# Altium footprint library Connektor.PcbLib: 305 footprints (part 1 of 20)
Each footprint in its own frame and in the unit in brackets; x right, y up, seen from the top. Pads: shape width x height; smd on the part's side, far side on the other; paste and mask are expansions set on the pad; w line width, h text height; cw(c..) or ccw(c..) is an arc to the next point about the centre after c.
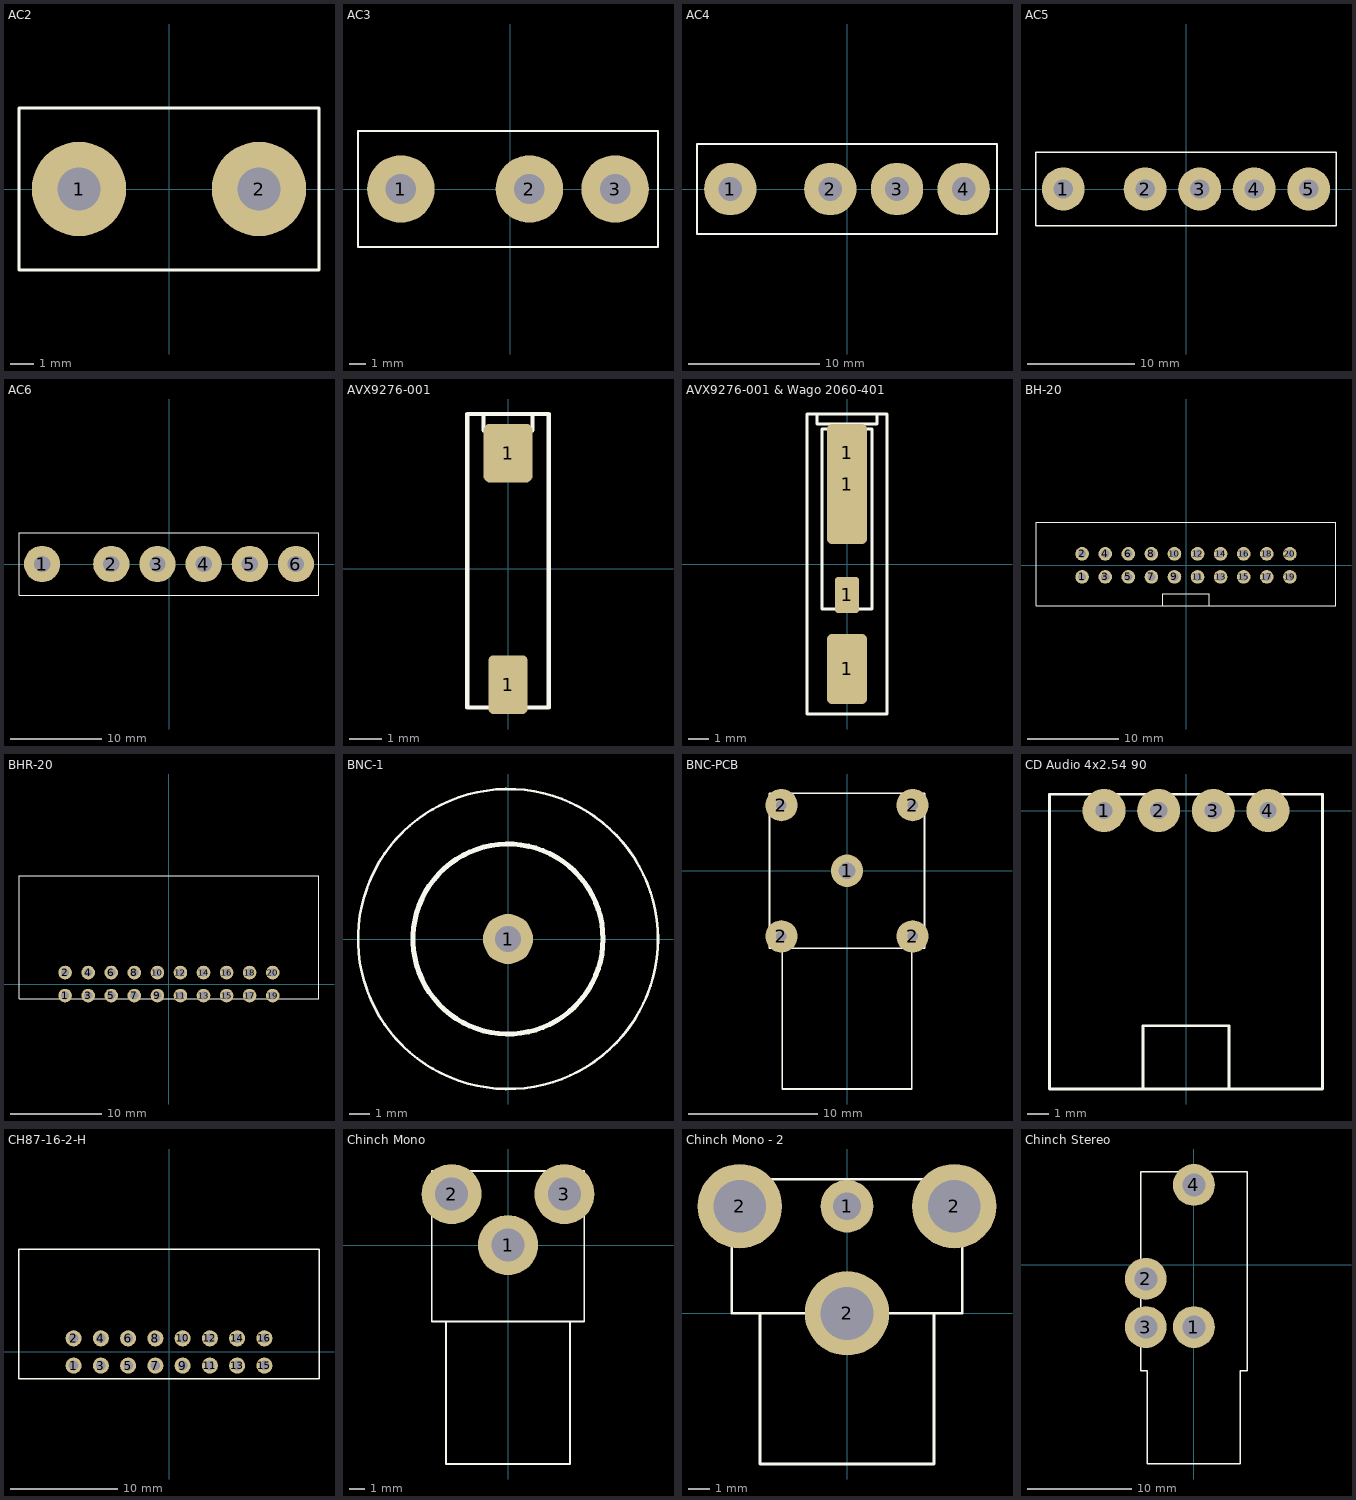
[diagram p0: the footprints below, top view; thin cyan lines are the x and y axes]

## AC2 [mm]
pads (2):
  round 4 hole 1.8: 1(-3.81,0) 2(3.81,0)
TopOverlay:
  lines w0.127: -6.35,-3.429 6.35,-3.429 6.35,3.429 -6.35,3.429 -6.35,-3.429
3D body: height 12.6, standoff -3.4, extent -6.3,-2.3 6.3,2.3

## AC3 [mm]
pads (3):
  round 4 hole 1.8: 1(-6.477,0) 2(1.143,0) 3(6.223,0)
TopOverlay:
  lines w0.127: -9.017,-3.429 -9.017,3.429 8.763,3.429 8.763,-3.429 -9.017,-3.429

## AC4 [mm]
pads (4):
  round 4 hole 1.8: 1(-8.89,0) 2(-1.27,0) 3(3.81,0) 4(8.89,0)
TopOverlay:
  lines w0.127: -11.43,-3.429 -11.43,3.429 11.43,3.429 11.43,-3.429 -11.43,-3.429

## AC5 [mm]
pads (5):
  round 4 hole 1.8: 1(-11.43,0) 2(-3.81,0) 3(1.27,0) 4(6.35,0) 5(11.43,0)
TopOverlay:
  lines w0.127: -13.97,-3.429 -13.97,3.429 13.97,3.429 13.97,-3.429 -13.97,-3.429

## AC6 [mm]
pads (6):
  round 4 hole 1.8: 1(-13.97,0) 2(-6.35,0) 3(-1.27,0) 4(3.81,0) 5(8.89,0) 6(13.97,0)
TopOverlay:
  lines w0.127: -16.51,-3.429 16.51,-3.429 16.51,3.429 -16.51,3.429 -16.51,-3.429

## AVX9276-001 [mm]
pads (2):
  rrect25% 1.2x1.8 smd paste-5: 1(0,-3.55)
  rrect25% 1.5x1.8 smd paste-5: 1(0,3.55)
TopOverlay:
  lines w0.127: -0.75,4.75 -0.75,4.25 0.75,4.25 0.75,4.75 ; -1.25,-4.25 -1.25,4.75 1.25,4.75 1.25,-4.25 -1.25,-4.25
TopPaste:
  region: 0.6,3.5 0.1,3.5 0.1,2.8 0.6,2.8
  rectangle: -0.6,2.8 -0.1,3.5
  rectangle: -0.6,3.6 -0.1,4.3
  region: 0.6,4.3 0.1,4.3 0.1,3.6 0.6,3.6
  region: 0.5,-2.8 0.1,-2.8 0.1,-3.5 0.5,-3.5
  rectangle: -0.5,-3.5 -0.1,-2.8
  rectangle: -0.5,-4.3 -0.1,-3.6
  region: 0.5,-3.6 0.1,-3.6 0.1,-4.3 0.5,-4.3

## AVX9276-001 & Wago 2060-401 [mm]
pads (4):
  rrect25% 2x3.5 smd paste-5: 1(0,-5.25)
  rrect25% 1.2x1.8 smd paste-5: 1(0,-1.55)
  rrect25% 2x6 smd paste-5: 1(0,4)
  rrect25% 1.5x1.8 smd paste-5: 1(0,5.55)
TopOverlay:
  lines w0.127: -1.5,7.5 -1.5,7 1.5,7 1.5,7.5 ; -0.75,6.75 -0.75,6.25 0.75,6.25 0.75,6.75 ; -2,-7.5 2,-7.5 2,7.5 -2,7.5 -2,-7.5 ; -1.25,-2.25 1.25,-2.25 1.25,6.75 -1.25,6.75 -1.25,-2.25
TopPaste:
  region: 0.5,-1.6 0.1,-1.6 0.1,-2.3 0.5,-2.3
  rectangle: -0.5,-2.3 -0.1,-1.6
  rectangle: -0.5,-1.5 -0.1,-0.8
  region: 0.5,-0.8 0.1,-0.8 0.1,-1.5 0.5,-1.5
  region: 0.6,6.3 0.1,6.3 0.1,5.6 0.6,5.6
  rectangle: -0.6,5.6 -0.1,6.3
  rectangle: -0.6,4.8 -0.1,5.5
  region: 0.6,5.5 0.1,5.5 0.1,4.8 0.6,4.8
  rectangle: -0.9,1.2 -0.15,3.85
  rectangle: 0.15,1.2 0.9,3.85
  rectangle: -0.9,-6.8 -0.15,-5.4
  rectangle: 0.15,-6.8 0.9,-5.4
  rectangle: 0.15,-5.1 0.9,-3.7
  rectangle: -0.9,-5.1 -0.15,-3.7

## BH-20 [mm]
pads (20):
  round 1.5 hole 0.9: 1(-11.43,-1.27) 2(-11.43,1.27) 3(-8.89,-1.27) 4(-8.89,1.27) 5(-6.35,-1.27) 6(-6.35,1.27) 7(-3.81,-1.27) 8(-3.81,1.27) 9(-1.27,-1.27) 10(-1.27,1.27) 11(1.27,-1.27) 12(1.27,1.27) 13(3.81,-1.27) 14(3.81,1.27) 15(6.35,-1.27) 16(6.35,1.27) 17(8.89,-1.27) 18(8.89,1.27) 19(11.43,-1.27) 20(11.43,1.27)
TopOverlay:
  lines w0.127: -2.54,-4.45 -2.54,-3.135 2.54,-3.135 2.54,-4.45 ; -16.51,-4.45 16.51,-4.45 16.51,4.75 -16.51,4.75 -16.51,-4.45
3D body: height 9.34, standoff -2.8, extent -16.53,-4.45 16.53,4.75

## BHR-20 [mm]
pads (20):
  round 1.5 hole 0.9: 1(-11.43,-1.27) 2(-11.43,1.27) 3(-8.89,-1.27) 4(-8.89,1.27) 5(-6.35,-1.27) 6(-6.35,1.27) 7(-3.81,-1.27) 8(-3.81,1.27) 9(-1.27,-1.27) 10(-1.27,1.27) 11(1.27,-1.27) 12(1.27,1.27) 13(3.81,-1.27) 14(3.81,1.27) 15(6.35,-1.27) 16(6.35,1.27) 17(8.89,-1.27) 18(8.89,1.27) 19(11.43,-1.27) 20(11.43,1.27)
TopOverlay:
  lines w0.127: -16.51,-1.59 -16.51,11.952 16.53,11.952 16.53,-1.59 -16.51,-1.59
3D body: height 9.35, standoff -2.85, extent -16.53,-1.59 16.53,11.952

## BNC-1 [mm]
pads (1):
  round 2.5 hole 1.3: 1(0,0)
TopOverlay:
  circle w0.254: c0,0 r4.75
  circle w0.127: c0,0 r7.5

## BNC-PCB [mm]
pads (5):
  round 2.5 hole 1.3: 1(0,0)
  round 2.5 hole 0.8: 2(-5.08,-5.08) 2(-5.08,5.08) 2(5.08,-5.08) 2(5.08,5.08)
TopOverlay:
  lines w0.127: -5,-6 -5,-16.9 5,-16.9 5,-6 ; -6,-6 6,-6 6,6 -6,6 -6,-6
3D body: height 18.65, standoff -4, extent -5.5,-16.9 5.5,5.5

## CD Audio 4x2.54 90 [mm]
pads (4):
  round 2 hole 0.8: 1(-3.81,0) 2(-1.27,0) 3(1.27,0) 4(3.81,0)
TopOverlay:
  lines w0.127: -2,-12.945 -2,-10 2,-10 2,-12.945 ; -6.35,-12.945 6.35,-12.945 6.35,0.75 -6.35,0.75 -6.35,-12.945
3D body: height 4.06, standoff -6.22, extent -6.35,-12.89 6.35,0.699

## CH87-16-2-H [mm]
pads (16):
  round 1.5 hole 0.9: 1(-8.89,-1.27) 2(-8.89,1.27) 3(-6.35,-1.27) 4(-6.35,1.27) 5(-3.81,-1.27) 6(-3.81,1.27) 7(-1.27,-1.27) 8(-1.27,1.27) 9(1.27,-1.27) 10(1.27,1.27) 11(3.81,-1.27) 12(3.81,1.27) 13(6.35,-1.27) 14(6.35,1.27) 15(8.89,-1.27) 16(8.89,1.27)
TopOverlay:
  lines w0.127: -13.97,-2.5 13.97,-2.5 13.97,9.565 -13.97,9.565 -13.97,-2.5

## Chinch Mono [mm]
pads (3):
  round 4 hole 2.2: 1(0,0) 2(-3.755,3.4) 3(3.755,3.4)
TopOverlay:
  lines w0.127: -4.125,-5.08 -4.125,-14.579 4.125,-14.579 4.125,-5.08 ; -5.08,-5.08 -5.08,4.928 5.08,4.928 5.08,-5.08 -5.08,-5.08
3D body: height 13, standoff -3.99, extent -5.004,-14.579 5.004,4.928

## Chinch Mono - 2 [mm]
pads (4):
  round 2.5 hole 1.321: 1(0,5.08)
  round 4 hole 2.5: 2(-5.08,5.08) 2(0,0) 2(5.08,5.08)
TopOverlay:
  lines w0.127: -4.125,0 -4.125,-7.137 4.125,-7.137 4.125,0 ; -5.461,0 -5.461,6.35 5.461,6.35 5.461,0 -5.461,0
3D body: height 12.08, standoff -4.05, extent -5.461,-7.137 5.461,6.35

## Chinch Stereo [mm]
pads (4):
  round 4 hole 2.2: 1(0,-5.96) 2(-4.6,-1.36) 3(-4.6,-5.96) 4(0,7.62)
TopOverlay:
  lines w0.127: -5.08,-10.16 -4.445,-10.16 -4.445,-19.05 4.445,-19.05 4.445,-10.16 5.08,-10.16 5.08,8.89 -5.08,8.89 -5.08,0 -5.08,-10.16